# Altium footprint library 集大电协1.5.PcbLib: 227 footprints (part 8 of 18) (continued)
## LOGO_JMU100 [mm] (continued)
  text "1918-2018" at 6.825,-7.9 h1.78
Bottom Solder:
  drawing of 979 lines, arcs and shapes, not listed
  text "1918-2018" at 6.825,-7.9 h1.78

## LOGO_Led [mm]
Top Layer:
  lines w0.025: -1.372,-0.127 1.854,-0.127 ; -1.372,-0.102 1.854,-0.102 ; -1.372,-0.076 1.854,-0.076 ; -1.372,-0.051 1.854,-0.051 ; -1.372,-0.025 1.854,-0.025 ; -1.372,0 1.854,0 ; -0.533,-0.787 -0.483,-0.787 ; -0.533,-0.762 -0.432,-0.762 ; -0.533,-0.737 -0.381,-0.737 ; -0.533,-0.711 -0.33,-0.711 ; -0.533,-0.686 -0.305,-0.686 ; -0.533,-0.66 -0.254,-0.66 ; -0.533,-0.635 -0.203,-0.635 ; -0.533,-0.61 -0.152,-0.61 ; -0.533,-0.584 -0.406,-0.584 ; -0.533,-0.559 -0.406,-0.559 ; -0.533,-0.533 -0.406,-0.533 ; -0.533,-0.508 -0.406,-0.508 ; -0.533,-0.483 -0.406,-0.483 ; -0.533,-0.457 -0.406,-0.457 ; -0.533,-0.432 -0.406,-0.432 ; -0.533,-0.406 -0.406,-0.406 ; -0.533,-0.381 -0.406,-0.381 ; -0.533,-0.356 -0.406,-0.356 ; -0.533,-0.33 -0.406,-0.33 ; -0.533,-0.305 -0.406,-0.305 ; -0.533,-0.279 -0.406,-0.279 ; -0.533,-0.254 -0.406,-0.254 ; -0.533,-0.229 -0.406,-0.229 ; -0.533,-0.203 -0.406,-0.203 ; -0.533,-0.178 -0.406,-0.178 ; -0.533,-0.152 -0.406,-0.152 ; -0.533,0.025 -0.406,0.025 ; -0.533,0.051 -0.406,0.051 ; -0.533,0.076 -0.406,0.076 ; -0.533,0.102 -0.406,0.102 ; -0.533,0.127 -0.406,0.127 ; -0.533,0.152 -0.406,0.152 ; -0.533,0.178 -0.406,0.178 ; -0.533,0.203 -0.406,0.203 ; -0.533,0.229 -0.406,0.229 ; -0.533,0.254 -0.406,0.254 ; -0.533,0.279 -0.406,0.279 ; -0.533,0.305 -0.406,0.305 ; -0.533,0.33 -0.406,0.33 ; -0.533,0.356 -0.406,0.356 ; -0.533,0.381 -0.406,0.381 ; -0.533,0.406 -0.406,0.406 ; -0.533,0.432 -0.406,0.432 ; -0.533,0.457 -0.406,0.457 ; -0.533,0.483 -0.127,0.483 ; -0.533,0.508 -0.178,0.508 ; -0.533,0.533 -0.229,0.533 ; -0.533,0.559 -0.279,0.559 ; -0.533,0.584 -0.33,0.584 ; -0.533,0.61 -0.381,0.61 ; -0.533,0.635 -0.432,0.635 ; -0.533,0.66 -0.483,0.66 ; -0.406,0.762 -0.305,0.762 ; -0.406,0.787 -0.305,0.787 ; -0.406,0.813 -0.279,0.813 ; -0.406,0.838 -0.279,0.838 ; -0.406,0.864 -0.279,0.864 ; -0.406,0.889 -0.279,0.889 ; -0.406,0.914 -0.279,0.914 ; -0.406,0.94 -0.127,0.94 ; -0.406,0.965 -0.152,0.965 ; -0.381,0.991 -0.152,0.991 ; -0.381,1.016 0,1.016 ; -0.381,1.041 0.025,1.041 ; -0.381,1.067 0.025,1.067 ; -0.381,1.092 0.025,1.092 ; -0.381,1.118 -0.102,1.118 ; -0.381,1.143 -0.279,1.143 ; -0.356,-0.584 -0.102,-0.584 ; -0.356,0.457 -0.076,0.457 ; -0.305,-0.559 -0.051,-0.559 ; -0.305,0.432 -0.051,0.432 ; -0.279,-0.533 0,-0.533 ; -0.279,0.406 0,0.406 ; -0.254,0.914 -0.102,0.914 ; -0.229,-0.508 0.051,-0.508 ; -0.229,0.381 0.051,0.381 ; -0.229,0.864 -0.076,0.864 ; -0.229,0.889 -0.076,0.889 ; -0.203,0.838 -0.051,0.838 ; -0.178,-0.483 0.102,-0.483 ; -0.178,0.356 0.102,0.356 ; -0.178,0.813 -0.025,0.813 ; -0.152,0.762 0,0.762 ; -0.152,0.787 0,0.787 ; -0.127,-0.457 0.152,-0.457 ; -0.127,0.33 0.152,0.33 ; -0.127,0.737 0.025,0.737 ; -0.102,0.711 0.051,0.711 ; -0.076,-0.432 0.203,-0.432 ; -0.076,0.305 0.203,0.305 ; -0.076,0.66 0.076,0.66 ; -0.076,0.686 0.076,0.686 ; -0.076,0.991 0,0.991 ; -0.051,0.635 0.102,0.635 ; -0.025,-0.406 0.254,-0.406 ; -0.025,0.279 0.254,0.279 ; -0.025,0.61 0.127,0.61 ; 0,0.559 0.152,0.559 ; 0,0.584 0.152,0.584 ; 0.025,-0.381 0.305,-0.381 ; 0.025,0.254 0.305,0.254 ; 0.025,0.533 0.152,0.533 ; 0.051,0.508 0.127,0.508 ; 0.076,-0.356 0.356,-0.356 ; 0.076,0.229 0.356,0.229 ; 0.076,0.483 0.102,0.483 ; 0.127,-0.33 0.406,-0.33 ; 0.127,0.203 0.406,0.203 ; 0.152,0.787 0.279,0.787 ; 0.152,0.813 0.279,0.813 ; 0.152,0.838 0.279,0.838 ; 0.152,0.864 0.279,0.864 ; 0.152,0.889 0.279,0.889 ; 0.152,0.914 0.279,0.914 ; 0.178,-0.305 0.457,-0.305 ; 0.178,0.178 0.457,0.178 ; 0.178,0.762 0.254,0.762 ; 0.178,0.94 0.432,0.94 ; 0.178,0.965 0.432,0.965 ; 0.178,0.991 0.406,0.991 ; 0.178,1.016 0.584,1.016 ; 0.178,1.041 0.584,1.041 ; 0.178,1.067 0.584,1.067 ; 0.178,1.092 0.584,1.092 ; 0.203,1.118 0.457,1.118 ; 0.203,1.143 0.305,1.143 ; 0.229,-0.279 0.508,-0.279 ; 0.229,0.152 0.508,0.152 ; 0.279,-0.254 0.559,-0.254 ; 0.279,0.127 0.559,0.127 ; 0.305,0.914 0.457,0.914 ; 0.33,-0.229 0.61,-0.229 ; 0.33,0.102 0.61,0.102 ; 0.33,0.889 0.483,0.889 ; 0.356,0.838 0.508,0.838 ; 0.356,0.864 0.508,0.864 ; 0.381,-0.203 0.66,-0.203 ; 0.381,0.076 0.66,0.076 ; 0.381,0.813 0.533,0.813 ; 0.406,0.787 0.559,0.787 ; 0.432,-0.178 0.711,-0.178 ; 0.432,0.051 0.711,0.051 ; 0.432,0.737 0.584,0.737 ; 0.432,0.762 0.584,0.762 ; 0.457,0.711 0.61,0.711 ; 0.483,-0.152 0.762,-0.152 ; 0.483,0.025 0.762,0.025 ; 0.483,0.686 0.635,0.686 ; 0.483,0.991 0.584,0.991 ; 0.508,0.635 0.66,0.635 ; 0.508,0.66 0.66,0.66 ; 0.533,0.61 0.686,0.61 ; 0.559,0.584 0.711,0.584 ; 0.584,0.533 0.711,0.533 ; 0.584,0.559 0.737,0.559 ; 0.61,0.508 0.686,0.508 ; 0.635,0.483 0.66,0.483 ; 0.813,-0.787 0.94,-0.787 ; 0.813,-0.762 0.94,-0.762 ; 0.813,-0.737 0.94,-0.737 ; 0.813,-0.711 0.94,-0.711 ; 0.813,-0.686 0.94,-0.686 ; 0.813,-0.66 0.94,-0.66 ; 0.813,-0.635 0.94,-0.635 ; 0.813,-0.61 0.94,-0.61 ; 0.813,-0.584 0.94,-0.584 ; 0.813,-0.559 0.94,-0.559 ; 0.813,-0.533 0.94,-0.533 ; 0.813,-0.508 0.94,-0.508 ; 0.813,-0.483 0.94,-0.483 ; 0.813,-0.457 0.94,-0.457 ; 0.813,-0.432 0.94,-0.432 ; 0.813,-0.406 0.94,-0.406 ; 0.813,-0.381 0.94,-0.381 ; 0.813,-0.356 0.94,-0.356 ; 0.813,-0.33 0.94,-0.33 ; 0.813,-0.305 0.94,-0.305 ; 0.813,-0.279 0.94,-0.279 ; 0.813,-0.254 0.94,-0.254 ; 0.813,-0.229 0.94,-0.229 ; 0.813,-0.203 0.94,-0.203 ; 0.813,-0.178 0.94,-0.178 ; 0.813,-0.152 0.94,-0.152 ; 0.813,0.025 0.94,0.025 ; 0.813,0.051 0.94,0.051 ; 0.813,0.076 0.94,0.076 ; 0.813,0.102 0.94,0.102 ; 0.813,0.127 0.94,0.127 ; 0.813,0.152 0.94,0.152 ; 0.813,0.178 0.94,0.178 ; 0.813,0.203 0.94,0.203 ; 0.813,0.229 0.94,0.229 ; 0.813,0.254 0.94,0.254 ; 0.813,0.279 0.94,0.279 ; 0.813,0.305 0.94,0.305 ; 0.813,0.33 0.94,0.33 ; 0.813,0.356 0.94,0.356 ; 0.813,0.381 0.94,0.381 ; 0.813,0.406 0.94,0.406 ; 0.813,0.432 0.94,0.432 ; 0.813,0.457 0.94,0.457 ; 0.813,0.483 0.94,0.483 ; 0.813,0.508 0.94,0.508 ; 0.813,0.533 0.94,0.533 ; 0.813,0.559 0.94,0.559 ; 0.813,0.584 0.94,0.584 ; 0.813,0.61 0.94,0.61 ; 0.813,0.635 0.94,0.635 ; 0.813,0.66 0.94,0.66

## LOGO_Load [mm]
Top Layer:
  lines w0.023: -2.243,-0.958 -1.808,-0.958 ; -2.243,-0.935 -1.831,-0.935 ; -2.243,-0.912 -1.831,-0.912 ; -2.243,-0.889 -1.831,-0.889 ; -2.243,-0.866 -1.854,-0.866 ; -2.243,-0.843 -1.854,-0.843 ; -2.243,-0.82 -1.854,-0.82 ; -2.243,-0.798 -1.854,-0.798 ; -2.243,-0.775 -1.854,-0.775 ; -2.243,-0.752 -1.854,-0.752 ; -2.243,-0.729 -1.854,-0.729 ; -2.243,-0.706 -1.854,-0.706 ; -2.243,-0.683 -1.854,-0.683 ; -2.243,-0.66 -1.854,-0.66 ; -2.243,-0.638 -1.854,-0.638 ; -2.243,-0.615 -1.854,-0.615 ; -2.243,-0.592 -1.854,-0.592 ; -2.243,-0.569 -1.854,-0.569 ; -2.243,-0.546 -1.854,-0.546 ; -2.243,-0.523 -1.854,-0.523 ; -2.243,-0.5 -1.854,-0.5 ; -2.243,-0.478 -1.854,-0.478 ; -2.243,-0.455 -1.854,-0.455 ; -2.243,-0.432 -1.854,-0.432 ; -2.243,-0.409 -1.854,-0.409 ; -2.243,-0.386 -1.854,-0.386 ; -2.243,-0.363 -1.854,-0.363 ; -2.243,-0.34 -1.854,-0.34 ; -2.243,-0.318 -1.854,-0.318 ; -2.243,-0.295 -1.854,-0.295 ; -2.243,-0.272 -1.854,-0.272 ; -2.243,-0.249 -1.854,-0.249 ; -2.243,-0.226 -1.854,-0.226 ; -2.243,-0.203 -1.854,-0.203 ; -2.243,-0.18 -1.854,-0.18 ; -2.243,-0.157 -1.854,-0.157 ; -2.243,-0.135 -1.854,-0.135 ; -2.243,-0.112 -1.854,-0.112 ; -2.243,-0.089 -1.854,-0.089 ; -2.243,-0.066 -1.854,-0.066 ; -2.243,-0.043 -1.854,-0.043 ; -2.243,-0.02 -1.854,-0.02 ; -2.243,0.003 -1.854,0.003 ; -2.22,-1.049 -1.694,-1.049 ; -2.22,-1.026 -1.74,-1.026 ; -2.22,-1.003 -1.786,-1.003 ; -2.22,-0.98 -1.808,-0.98 ; -2.22,0.025 -1.854,0.025 ; -2.22,0.048 -1.877,0.048 ; -2.197,-1.095 2.146,-1.095 ; -2.197,-1.072 2.146,-1.072 ; -2.197,0.071 -1.877,0.071 ; -2.174,-1.14 2.123,-1.14 ; -2.174,-1.118 2.123,-1.118 ; -2.174,0.094 -1.9,0.094 ; -2.151,-1.186 2.101,-1.186 ; -2.151,-1.163 2.101,-1.163 ; -2.151,0.117 -1.946,0.117 ; -2.129,-1.209 2.078,-1.209 ; -2.106,-1.255 2.032,-1.255 ; -2.106,-1.232 2.055,-1.232 ; -2.083,-1.278 2.009,-1.278 ; -2.083,0.14 -1.991,0.14 ; -2.06,-1.3 1.986,-1.3 ; -2.014,-1.323 1.963,-1.323 ; -1.991,-1.346 1.941,-1.346 ; -1.968,-1.369 1.895,-1.369 ; -1.923,-1.392 1.872,-1.392 ; -1.877,-1.415 1.826,-1.415 ; -1.808,-1.438 1.758,-1.438 ; -1.237,0.917 -0.711,0.917 ; -1.237,0.94 -0.734,0.94 ; -1.237,0.963 -0.757,0.963 ; -1.237,0.986 -0.78,0.986 ; -1.214,0.871 -0.665,0.871 ; -1.214,0.894 -0.688,0.894 ; -1.214,1.008 -0.803,1.008 ; -1.214,1.031 -0.826,1.031 ; -1.214,1.054 -0.848,1.054 ; -1.191,0.826 -0.62,0.826 ; -1.191,0.848 -0.643,0.848 ; -1.191,1.077 -0.871,1.077 ; -1.168,0.803 -0.597,0.803 ; -1.168,1.1 -0.894,1.1 ; -1.146,0.78 -0.574,0.78 ; -1.146,1.123 -0.917,1.123 ; -1.123,0.757 -0.551,0.757 ; -1.1,0.734 -0.528,0.734 ; -1.1,1.146 -0.963,1.146 ; -1.077,0.711 -0.505,0.711 ; -1.054,0.688 -0.483,0.688 ; -1.031,0.665 -0.46,0.665 ; -1.008,0.643 -0.437,0.643 ; -0.986,0.62 -0.414,0.62 ; -0.963,0.597 -0.391,0.597 ; -0.94,0.574 -0.368,0.574 ; -0.917,0.551 -0.345,0.551 ; -0.894,0.528 -0.323,0.528 ; -0.871,0.505 -0.3,0.505 ; -0.848,0.483 -0.277,0.483 ; -0.826,0.46 -0.254,0.46 ; -0.803,0.437 0.752,0.437 ; -0.78,0.414 0.729,0.414 ; -0.757,0.391 0.706,0.391 ; -0.734,0.368 0.683,0.368 ; -0.711,0.345 0.66,0.345 ; -0.688,0.323 0.638,0.323 ; -0.665,0.3 0.615,0.3 ; -0.643,0.277 0.592,0.277 ; -0.62,0.254 0.569,0.254 ; -0.597,0.231 0.546,0.231 ; -0.574,0.208 0.523,0.208 ; -0.551,0.185 0.5,0.185 ; -0.528,0.163 0.478,0.163 ; -0.505,0.14 0.455,0.14 ; -0.483,0.117 0.432,0.117 ; -0.46,0.094 0.409,0.094 ; -0.437,0.071 0.386,0.071 ; -0.414,0.048 0.363,0.048 ; -0.391,0.025 0.34,0.025 ; -0.368,0.003 0.318,0.003 ; -0.345,-0.02 0.295,-0.02 ; -0.323,-0.043 0.272,-0.043 ; -0.3,-0.066 0.249,-0.066 ; -0.277,-0.089 0.226,-0.089 ; -0.254,-0.112 0.203,-0.112 ; -0.231,-0.135 0.18,-0.135 ; -0.231,0.46 0.18,0.46 ; -0.231,0.483 0.18,0.483 ; -0.231,0.505 0.18,0.505 ; -0.231,0.528 0.18,0.528 ; -0.231,0.551 0.18,0.551 ; -0.231,0.574 0.18,0.574 ; -0.231,0.597 0.18,0.597 ; -0.231,0.62 0.18,0.62 ; -0.231,0.643 0.18,0.643 ; -0.231,0.665 0.18,0.665 ; -0.231,0.688 0.18,0.688 ; -0.231,0.711 0.18,0.711 ; -0.231,0.734 0.18,0.734 ; -0.231,0.757 0.18,0.757 ; -0.231,0.78 0.18,0.78 ; -0.231,0.803 0.18,0.803 ; -0.231,0.826 0.18,0.826 ; -0.231,0.848 0.18,0.848 ; -0.231,0.871 0.18,0.871 ; -0.231,0.894 0.18,0.894 ; -0.231,0.917 0.18,0.917 ; -0.231,0.94 0.18,0.94 ; -0.231,0.963 0.18,0.963 ; -0.231,0.986 0.18,0.986 ; -0.231,1.008 0.18,1.008 ; -0.231,1.031 0.18,1.031 ; -0.231,1.054 0.18,1.054 ; -0.231,1.077 0.18,1.077 ; -0.231,1.1 0.18,1.1 ; -0.231,1.123 0.18,1.123 ; -0.231,1.146 0.18,1.146 ; -0.231,1.168 0.18,1.168 ; -0.231,1.191 0.18,1.191 ; -0.231,1.214 0.18,1.214 ; -0.231,1.237 0.18,1.237 ; -0.231,1.26 0.18,1.26 ; -0.231,1.283 0.18,1.283 ; -0.231,1.306 0.18,1.306 ; -0.231,1.328 0.18,1.328 ; -0.231,1.351 0.18,1.351 ; -0.231,1.374 0.18,1.374 ; -0.231,1.397 0.18,1.397 ; -0.231,1.42 0.18,1.42 ; -0.231,1.443 0.18,1.443 ; -0.231,1.466 0.18,1.466 ; -0.231,1.488 0.18,1.488 ; -0.231,1.511 0.18,1.511 ; -0.231,1.534 0.18,1.534 ; -0.231,1.557 0.18,1.557 ; -0.231,1.58 0.18,1.58 ; -0.231,1.603 0.18,1.603 ; -0.231,1.626 0.18,1.626 ; -0.231,1.648 0.18,1.648 ; -0.231,1.671 0.18,1.671 ; -0.231,1.694 0.18,1.694 ; -0.231,1.717 0.18,1.717 ; -0.231,1.74 0.18,1.74 ; -0.231,1.763 0.18,1.763 ; -0.231,1.786 0.18,1.786 ; -0.231,1.808 0.18,1.808 ; -0.231,1.831 0.18,1.831 ; -0.231,1.854 0.18,1.854 ; -0.231,1.877 0.18,1.877 ; -0.231,1.9 0.18,1.9 ; -0.231,1.923 0.18,1.923 ; -0.231,1.946 0.18,1.946 ; -0.231,1.968 0.18,1.968 ; -0.231,1.991 0.18,1.991 ; -0.231,2.014 0.18,2.014 ; -0.231,2.037 0.18,2.037 ; -0.231,2.06 0.18,2.06 ; -0.231,2.083 0.18,2.083 ; -0.231,2.106 0.18,2.106 ; -0.231,2.129 0.18,2.129 ; -0.231,2.151 0.18,2.151 ; -0.231,2.174 0.18,2.174 ; -0.231,2.197 0.18,2.197 ; -0.231,2.22 0.18,2.22 ; -0.231,2.243 0.18,2.243 ; -0.231,2.266 0.18,2.266 ; -0.231,2.289 0.18,2.289 ; -0.231,2.311 0.18,2.311 ; -0.231,2.334 0.18,2.334 ; -0.231,2.357 0.18,2.357 ; -0.231,2.38 0.18,2.38 ; -0.231,2.403 0.18,2.403 ; -0.231,2.426 0.18,2.426 ; -0.231,2.449 0.18,2.449 ; -0.231,2.471 0.18,2.471 ; -0.231,2.494 0.18,2.494 ; -0.231,2.517 0.18,2.517 ; -0.231,2.54 0.18,2.54 ; -0.231,2.563 0.157,2.563 ; -0.208,-0.157 0.157,-0.157 ; -0.208,2.586 0.157,2.586 ; -0.208,2.609 0.157,2.609 ; -0.208,2.631 0.157,2.631 ; -0.185,-0.18 0.135,-0.18 ; -0.185,2.654 0.135,2.654 ; -0.163,2.677 0.112,2.677 ; -0.14,-0.203 0.089,-0.203 ; -0.14,2.7 0.089,2.7 ; -0.117,-0.226 0.066,-0.226 ; -0.094,2.723 0.043,2.723 ; -0.048,-0.249 -0.003,-0.249 ; 0.203,0.46 0.775,0.46 ; 0.226,0.483 0.798,0.483 ; 0.249,0.505 0.82,0.505 ; 0.272,0.528 0.843,0.528 ; 0.295,0.551 0.866,0.551 ; 0.318,0.574 0.889,0.574 ; 0.34,0.597 0.912,0.597 ; 0.363,0.62 0.935,0.62 ; 0.386,0.643 0.958,0.643 ; 0.409,0.665 0.98,0.665 ; 0.432,0.688 1.003,0.688 ; 0.455,0.711 1.026,0.711 ; 0.478,0.734 1.049,0.734 ; 0.5,0.757 1.072,0.757 ; 0.523,0.78 1.095,0.78 ; 0.546,0.803 1.118,0.803 ; 0.569,0.826 1.14,0.826 ; 0.592,0.848 1.14,0.848 ; 0.615,0.871 1.163,0.871 ; 0.638,0.894 1.163,0.894 ; 0.66,0.917 1.163,0.917 ; 0.683,0.94 1.186,0.94 ; 0.706,0.963 1.186,0.963 ; 0.729,0.986 1.186,0.986 ; 0.752,1.008 1.163,1.008 ; 0.775,1.031 1.163,1.031 ; 0.798,1.054 1.163,1.054 ; 0.82,1.077 1.14,1.077 ; 0.843,1.1 1.118,1.1 ; 0.866,1.123 1.095,1.123 ; 0.912,1.146 1.049,1.146 ; 1.666,-1.049 2.169,-1.049 ; 1.689,-1.026 2.169,-1.026 ; 1.735,-1.003 2.169,-1.003 ; 1.735,-0.98 2.169,-0.98 ; 1.758,-0.958 2.192,-0.958 ; 1.781,-0.935 2.192,-0.935 ; 1.781,-0.912 2.192,-0.912 ; 1.781,-0.889 2.192,-0.889 ; 1.781,-0.866 2.192,-0.866 ; 1.803,-0.843 2.192,-0.843 ; 1.803,-0.82 2.192,-0.82 ; 1.803,-0.798 2.192,-0.798 ; 1.803,-0.775 2.192,-0.775 ; 1.803,-0.752 2.192,-0.752 ; 1.803,-0.729 2.192,-0.729 ; 1.803,-0.706 2.192,-0.706 ; 1.803,-0.683 2.192,-0.683 ; 1.803,-0.66 2.192,-0.66 ; 1.803,-0.638 2.192,-0.638 ; 1.803,-0.615 2.192,-0.615 ; 1.803,-0.592 2.192,-0.592 ; 1.803,-0.569 2.192,-0.569 ; 1.803,-0.546 2.192,-0.546 ; 1.803,-0.523 2.192,-0.523 ; 1.803,-0.5 2.192,-0.5 ; 1.803,-0.478 2.192,-0.478 ; 1.803,-0.455 2.192,-0.455 ; 1.803,-0.432 2.192,-0.432 ; 1.803,-0.409 2.192,-0.409 ; 1.803,-0.386 2.192,-0.386 ; 1.803,-0.363 2.192,-0.363 ; 1.803,-0.34 2.192,-0.34 ; 1.803,-0.318 2.192,-0.318 ; 1.803,-0.295 2.192,-0.295 ; 1.803,-0.272 2.192,-0.272 ; 1.803,-0.249 2.192,-0.249 ; 1.803,-0.226 2.192,-0.226 ; 1.803,-0.203 2.192,-0.203 ; 1.803,-0.18 2.192,-0.18 ; 1.803,-0.157 2.192,-0.157 ; 1.803,-0.135 2.192,-0.135 ; 1.803,-0.112 2.192,-0.112 ; 1.803,-0.089 2.192,-0.089 ; 1.803,-0.066 2.192,-0.066 ; 1.803,-0.043 2.192,-0.043 ; 1.803,-0.02 2.192,-0.02 ; 1.803,0.003 2.169,0.003 ; 1.803,0.025 2.169,0.025 ; 1.826,0.048 2.169,0.048 ; 1.826,0.071 2.146,0.071 ; 1.849,0.094 2.123,0.094 ; 1.895,0.117 2.101,0.117 ; 1.941,0.14 2.032,0.14